# Altium footprint library ACTION_Others.pcblib: 88 footprints (part 1 of 6)
Each footprint in its own frame and in the unit in brackets; x right, y up, seen from the top. Pads: shape width x height; smd on the part's side, far side on the other; paste and mask are expansions set on the pad; w line width, h text height; cw(c..) or ccw(c..) is an arc to the next point about the centre after c.
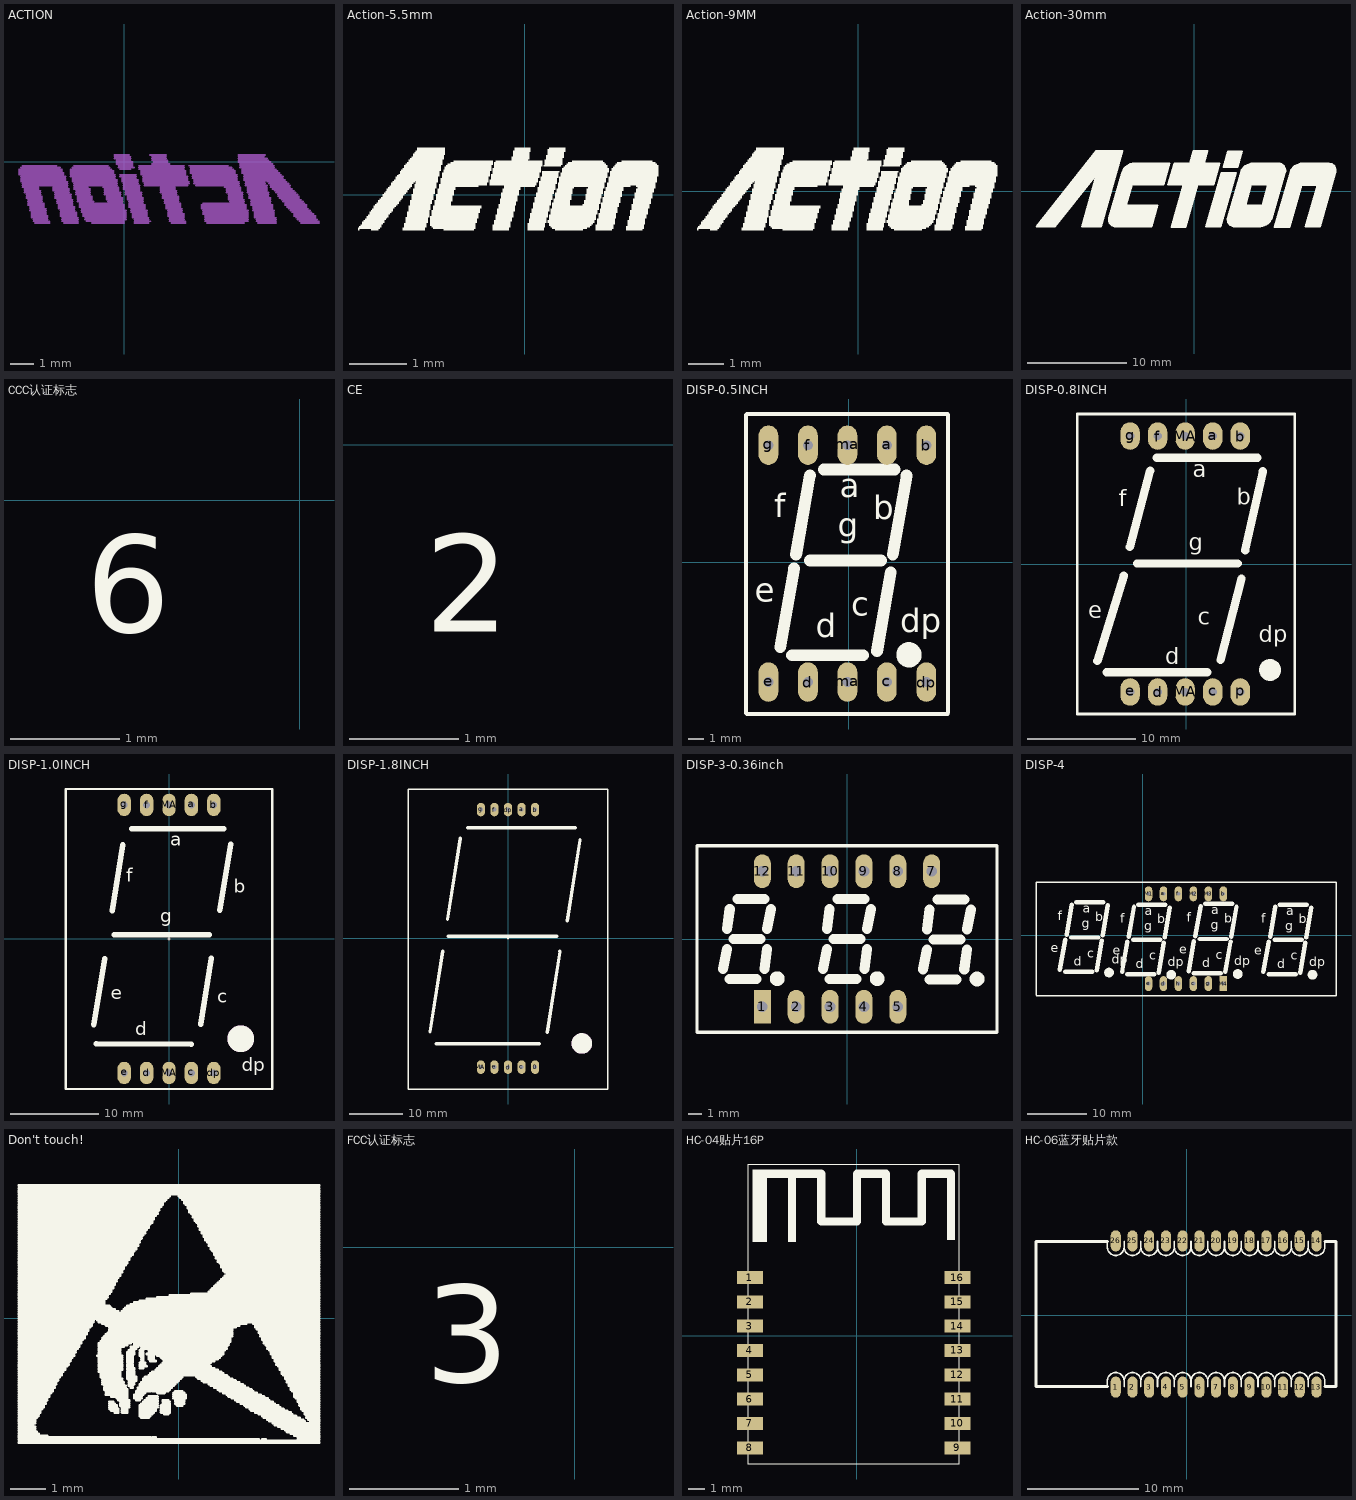
[diagram p0: the footprints below, top view; thin cyan lines are the x and y axes]

## ACTION [mm]
Bottom Overlay:
  drawing of 272 lines, arcs and shapes, not listed

## Action-5.5mm [mm]
Top Overlay:
  drawing of 391 lines, arcs and shapes, not listed

## Action-9MM [mm]
Top Overlay:
  drawing of 391 lines, arcs and shapes, not listed

## Action-30mm [mm]
Top Overlay:
  drawing of 330 lines, arcs and shapes, not listed

## CCC认证标志 [mm]
Top Overlay:
  text "6" at -1.956,-1.499 h1.52

## CE [mm]
Top Overlay:
  text "2" at -2.896,-2.007 h1.52

## DISP-0.5INCH [mil]
pads (10):
  oval 50x100 hole 25: a(97,297) b(197,297) c(97,-303) d(-103,-303) dp(197,-303) e(-203,-303) f(-103,297) g(-203,297) ma(-3,-303) ma(-3,297)
Top Overlay:
  circle w40: c153,-234 r12
  lines w10: -260,-382 -260,374 ; -258,-384 251,-384 ; -258,376 251,376 ; 252,-380 252,374
  lines w30: -173,-215 -138,-15 ; -143,-235 37,-235 ; -133,20 -98,220 ; -98,5 82,5 ; -63,235 117,235 ; 72,-225 107,-25 ; 112,20 147,220
  text "f" at -188,115 h60
  text "b" at 62,110 h60
  text "g" at -28,65 h60
  text "a" at -23,165 h60
  text "d" at -83,-190 h60
  text "e" at -238,-100 h60
  text "dp" at 131,-177 h60
  text "c" at 7,-135 h60
3D body "DISP 0.5inch.STEP": height 316.25, standoff -156.19, extent -250,-375 250,375

## DISP-0.8INCH [mil]
pads (10):
  oval 70x100 hole 30: a(97,465) b(197,465) c(97,-465) d(-103,-465) e(-203,-465) f(-103,465) g(-203,465) MA(-3,-465) MA(-3,465) p(197,-465)
Top Overlay:
  circle w40: c305.31,-385 r19.68
  lines w10: -395,-545 395,-545 395,545 -395,545 -395,-545
  lines w30: -322,-352 -226,-42 ; -289,-393 77.14,-393 ; -204,62 -130,339 ; -177.68,2.24 188.47,2.24 ; -108,-478 -103,-473 ; -106.14,386 260,386 ; 125,-349 202,-53 ; 215,49 279,337
  text "b" at 185,215 h60
  text "dp" at 265,-285 h60
  text "f" at -245,210 h60
  text "e" at -355,-198 h60
  text "d" at -75,-365 h60
  text "c" at 43,-220 h60
  text "g" at 10,50 h60
  text "a" at 25,315 h60

## DISP-1.0INCH [mil]
pads (10):
  oval 60x100 hole 30: a(100,598) b(200,598) c(100,-598) d(-100,-598) dp(200,-598) e(-200,-598) f(-100,598) g(-200,598) MA(0,-598) MA(0,598)
Top Overlay:
  lines w2: -6,0 6,0 ; 0,-6 0,5
  lines w10: -461,-10 -461,10 ; -460.88,-669.58 -460.88,669 ; -459.88,-669.58 461,-669.58 461,669 -459.88,669
  lines w25: -335,-382 -287,-89 ; -324,-467 99,-470 ; -254,126 -206,419 ; -244,19 179,19 ; -167,492 245,492 ; 141,-380 189,-87 ; 227,129 275,422
  text "g" at -40,75 h60
  text "dp" at 325,-590 h60
  text "f" at -190,255 h60
  text "e" at -260,-270 h60
  text "d" at -150,-430 h60
  text "c" at 215,-285 h60
  text "b" at 290,205 h60
  text "a" at 5,415 h60
Top Overlay keep-out:
  circle w100: c320.57,-445 r9.43
3D body "DISP 1.0inch.STEP": height 414.67, standoff -156.19, extent -475,-669.29 469.88,669.29

## DISP-1.8INCH [mil]
pads (10):
  oval 60x100 hole 30: 0(200,-950) a(100,950) b(200,950) c(100,-950) d(0,-950) dp(0,950) e(-100,-950) f(-100,950) g(-200,950) MA(-200,-950)
Top Overlay:
  lines w2: -5,0 5,0 ; 0,-5 0,4
  lines w10: -736,-1111 -736,1101.6 736,1101.6 736,-1111 -736,-1111
  lines w25: -575,-691 -481,-93 ; -528,-778 230,-778 ; -446,139 -352,737 ; -442,15 359,15 ; -299,815 496,815 ; 289,-694 383,-96 ; 437,128 531,726
Top Overlay keep-out:
  circle w100: c544.39,-775 r25.61

## DISP-3-0.36inch [mm]
pads (11):
  rect 1.27x2.54 hole 0.8: 1(-6.35,-5.08)
  oval 1.27x2.54 hole 0.8: 2(-3.81,-5.08) 3(-1.27,-5.08) 4(1.27,-5.08) 5(3.81,-5.08) 7(6.35,5.08) 8(3.81,5.08) 9(1.27,5.08) 10(-1.27,5.08) 11(-3.81,5.08) 12(-6.35,5.08)
Top Overlay:
  circle w0.8: c2.261,-2.972 r0.15
  circle w0.8: c-5.232,-2.972 r0.15
  circle w0.8: c9.754,-2.997 r0.15
  lines w0.254: -11.25,-7 11.25,-7 11.25,7 -11.25,7 -11.25,-7
  lines w0.762: -9.293,-2.25 -8.993,-0.75 ; -8.993,0.75 -8.793,2.25 ; -8.793,-3 -6.793,-3 ; -8.493,0 -6.493,0 ; -8.193,3 -6.193,3 ; -6.193,-2.25 -5.993,-0.75 ; -5.993,0.75 -5.693,2.25 ; -1.8,-2.25 -1.5,-0.75 ; -1.5,0.75 -1.3,2.25 ; -1.3,-3 0.7,-3 ; -1,0 1,0 ; -0.7,3 1.3,3 ; 1.3,-2.25 1.5,-0.75 ; 1.5,0.75 1.8,2.25 ; 5.693,-2.275 5.993,-0.775 ; 5.993,0.725 6.193,2.225 ; 6.193,-3.025 8.193,-3.025 ; 6.493,-0.025 8.493,-0.025 ; 6.793,2.975 8.793,2.975 ; 8.793,-2.275 8.993,-0.775 ; 8.993,0.725 9.293,2.225

## DISP-4 [mil]
pads (12):
  oval 50x100 hole 25: a(137,277) b(537,277) c(337,-323) d(137,-323) e(37,-323) f(237,277) g(437,-323) h(237,-323) M1(37,277) M2(337,277) M3(437,277)
  rect 50x100 hole 25: M4(537,-323)
Top Overlay:
  circle w40: c1133,-264 r12
  circle w40: c633,-259 r12
  circle w40: c-227,-249 r12
  circle w40: c188,-264 r12
  lines w10: -715,-405 1290,-405 ; -715,-401 -715,355 1290,355 1290,-404
  lines w30: -555,-230 -520,-30 ; -520,-245 -340,-245 ; -510,5 -475,205 ; -480,-15 -300,-15 ; -445,220 -265,220 ; -310,-235 -275,-35 ; -270,0 -235,200 ; -140,-245 -105,-45 ; -105,-260 75,-260 ; -95,-10 -60,190 ; -65,-30 115,-30 ; -30,205 150,205 ; 105,-250 140,-50 ; 145,-15 180,185 ; 305,-240 340,-40 ; 340,-255 520,-255 ; 350,-5 385,195 ; 380,-25 560,-25 ; 415,210 595,210 ; 550,-245 585,-45 ; 590,-10 625,190 ; 805,-245 840,-45 ; 840,-260 1020,-260 ; 850,-10 885,190 ; 880,-30 1060,-30 ; 915,205 1095,205 ; 1050,-250 1085,-50 ; 1090,-15 1125,185
  text "f" at 792,85 h60
  text "b" at 1042,80 h60
  text "g" at 952,35 h60
  text "a" at 957,135 h60
  text "d" at 897,-220 h60
  text "e" at 742,-130 h60
  text "dp" at 1111,-207 h60
  text "c" at 987,-165 h60
  text "f" at 292,90 h60
  text "b" at 542,85 h60
  text "g" at 452,40 h60
  text "a" at 457,140 h60
  text "d" at 397,-215 h60
  text "e" at 242,-125 h60
  text "dp" at 611,-202 h60
  text "c" at 487,-160 h60
  text "f" at -568,100 h60
  text "b" at -318,95 h60
  text "g" at -408,50 h60
  text "a" at -403,150 h60
  text "d" at -463,-205 h60
  text "e" at -618,-115 h60
  text "dp" at -209,-192 h60
  text "c" at -373,-150 h60
  text "f" at -153,85 h60
  text "b" at 97,80 h60
  text "g" at 7,35 h60
  text "a" at 12,135 h60
  text "d" at -48,-220 h60
  text "e" at -203,-130 h60
  text "dp" at 166,-207 h60
  text "c" at 42,-165 h60
3D body "DISP 4x7.STEP": height 314.96, standoff -137.8, extent -704.15,-396.01 1276.16,352.02

## Don't touch! [mm]
Top Overlay:
  drawing of 472 lines, arcs and shapes, not listed

## FCC认证标志 [mm]
Top Overlay:
  text "3" at -1.372,-1.524 h1.52

## HC-04贴片16P [mm]
pads (16):
  rect 1.6x0.8 smd: 1(-6.6,3.6) 2(-6.6,2.1) 3(-6.6,0.6) 4(-6.6,-0.9) 5(-6.6,-2.4) 6(-6.6,-3.9) 7(-6.6,-5.4) 8(-6.6,-6.9) 9(6.2,-6.9) 10(6.2,-5.4) 11(6.2,-3.9) 12(6.2,-2.4) 13(6.2,-0.9) 14(6.2,0.6) 15(6.2,2.1) 16(6.2,3.6)
Top Overlay:
  region: -4.25,7.05 -4.25,5.8 -3.75,5.8 -3.75,7.05
  rectangle: 5.55,5.9 6.05,6.2
  region: -6.45,10.25 -6.45,5.8 -5.55,5.8 -5.55,10.25
  lines w0.025: -6.7,-7.9 6.3,-7.9 6.3,10.6 -6.7,10.6 -6.7,-7.9
  lines w0.5: -6.2,10 -2.2,10 -2.2,7.05 0,7.05 0,10 1.8,10 1.8,7.05 4,7.05 4,10 5.8,10 5.8,6.15 ; -4,7.05 -4,10

## HC-06蓝牙贴片款 [mm]
pads (26):
  oval 0.9x1.9 smd: 1(-6.384,-6.423) 2(-4.884,-6.423) 3(-3.384,-6.423) 4(-1.884,-6.423) 5(-0.384,-6.423) 6(1.116,-6.423) 7(2.616,-6.423) 8(4.116,-6.423) 9(5.616,-6.423) 10(7.116,-6.423) 11(8.616,-6.423) 12(10.116,-6.423) 13(11.616,-6.423) 14(11.616,6.677) 15(10.116,6.677) 16(8.616,6.677) 17(7.116,6.677) 18(5.616,6.677) 19(4.116,6.677) 20(2.616,6.677) 21(1.116,6.677) 22(-0.384,6.677) 23(-1.884,6.677) 24(-3.384,6.677) 25(-4.884,6.677) 26(-6.384,6.677)
Top Overlay:
  lines w0.152: -7.134,-6.373 -7.134,-5.873 cw(c-6.384,-5.873) -5.634,-5.873 ; -7.134,5.977 -7.134,6.627 ; -7.134,6.127 ccw(c-6.384,6.127) -5.634,6.127 ccw(c-4.884,6.127) -4.134,6.127 ccw(c-3.384,6.127) -2.634,6.127 ccw(c-1.884,6.127) -1.134,6.127 ccw(c-0.384,6.127) 0.366,6.127 ccw(c1.116,6.127) 1.866,6.127 ccw(c2.616,6.127) 3.366,6.127 ccw(c4.116,6.127) 4.866,6.127 ccw(c5.616,6.127) 6.366,6.127 ccw(c7.116,6.127) 7.866,6.127 ccw(c8.616,6.127) 9.366,6.127 ccw(c10.116,6.127) 10.866,6.127 ; 10.866,5.977 10.866,6.627 10.866,6.127 ; 12.366,-6.373 12.366,-5.873 ccw(c11.616,-5.873) 10.866,-5.873 ; 12.366,6.627 12.366,6.127 cw(c11.616,6.127) 10.866,6.127 ; -5.634,-5.873 cw(c-4.884,-5.873) -4.134,-5.873 ; -5.634,-5.873 -5.634,-6.373 -5.634,-5.873 ; -4.134,-5.873 cw(c-3.384,-5.873) -2.634,-5.873 ; -4.134,-5.873 -4.134,-6.373 -4.134,-5.873 ; -2.634,-5.873 cw(c-1.884,-5.873) -1.134,-5.873 ; -2.634,-5.873 -2.634,-6.373 -2.634,-5.873 ; -1.134,-5.873 cw(c-0.384,-5.873) 0.366,-5.873 ; -1.134,-5.873 -1.134,-6.373 -1.134,-5.873 ; 0.366,-5.873 cw(c1.116,-5.873) 1.866,-5.873 ; 0.366,-5.873 0.366,-6.373 0.366,-5.873 ; 1.866,-5.873 cw(c2.616,-5.873) 3.366,-5.873 ; 1.866,-5.873 1.866,-6.373 1.866,-5.873 ; 3.366,-5.873 cw(c4.116,-5.873) 4.866,-5.873 ; 3.366,-5.873 3.366,-6.373 3.366,-5.873 ; 4.866,-5.873 cw(c5.616,-5.873) 6.366,-5.873 ; 4.866,-5.873 4.866,-6.373 4.866,-5.873 ; 6.366,-5.873 cw(c7.116,-5.873) 7.866,-5.873 ; 6.366,-5.873 6.366,-6.373 6.366,-5.873 ; 7.866,-5.873 cw(c8.616,-5.873) 9.366,-5.873 ; 7.866,-5.873 7.866,-6.373 7.866,-5.873 ; 9.366,-5.873 cw(c10.116,-5.873) 10.866,-5.873 ; 9.366,-5.873 9.366,-6.373 9.366,-5.873 ; 10.866,-5.873 10.866,-6.373 10.866,-5.873 ; -5.634,5.977 -5.634,6.627 -5.634,5.977 ; -4.134,5.977 -4.134,6.627 -4.134,5.977 ; -2.634,5.977 -2.634,6.627 -2.634,5.977 ; -1.134,5.977 -1.134,6.627 -1.134,5.977 ; 0.366,5.977 0.366,6.627 0.366,5.977 ; 1.866,5.977 1.866,6.627 1.866,5.977 ; 3.366,5.977 3.366,6.627 3.366,5.977 ; 4.866,5.977 4.866,6.627 4.866,5.977 ; 6.366,5.977 6.366,6.627 6.366,5.977 ; 7.866,5.977 7.866,6.627 7.866,5.977 ; 9.366,5.977 9.366,6.627 9.366,5.977
  lines w0.254: -7.134,-6.373 -13.534,-6.373 -13.534,6.627 -7.134,6.627 ; 12.366,-6.373 13.366,-6.373 13.366,6.627 12.366,6.627
3D body "User Library-Bluetooth HC-06_.STEP": height 2.35, standoff 0, extent -14.64,-6.858 13.37,7.162